# Altium footprint library 红旗_PcbLib_V1.0.PcbLib: 66 footprints (part 3 of 5)
Each footprint in its own frame and in the unit in brackets; x right, y up, seen from the top. Pads: shape width x height; smd on the part's side, far side on the other; paste and mask are expansions set on the pad; w line width, h text height; cw(c..) or ccw(c..) is an arc to the next point about the centre after c.
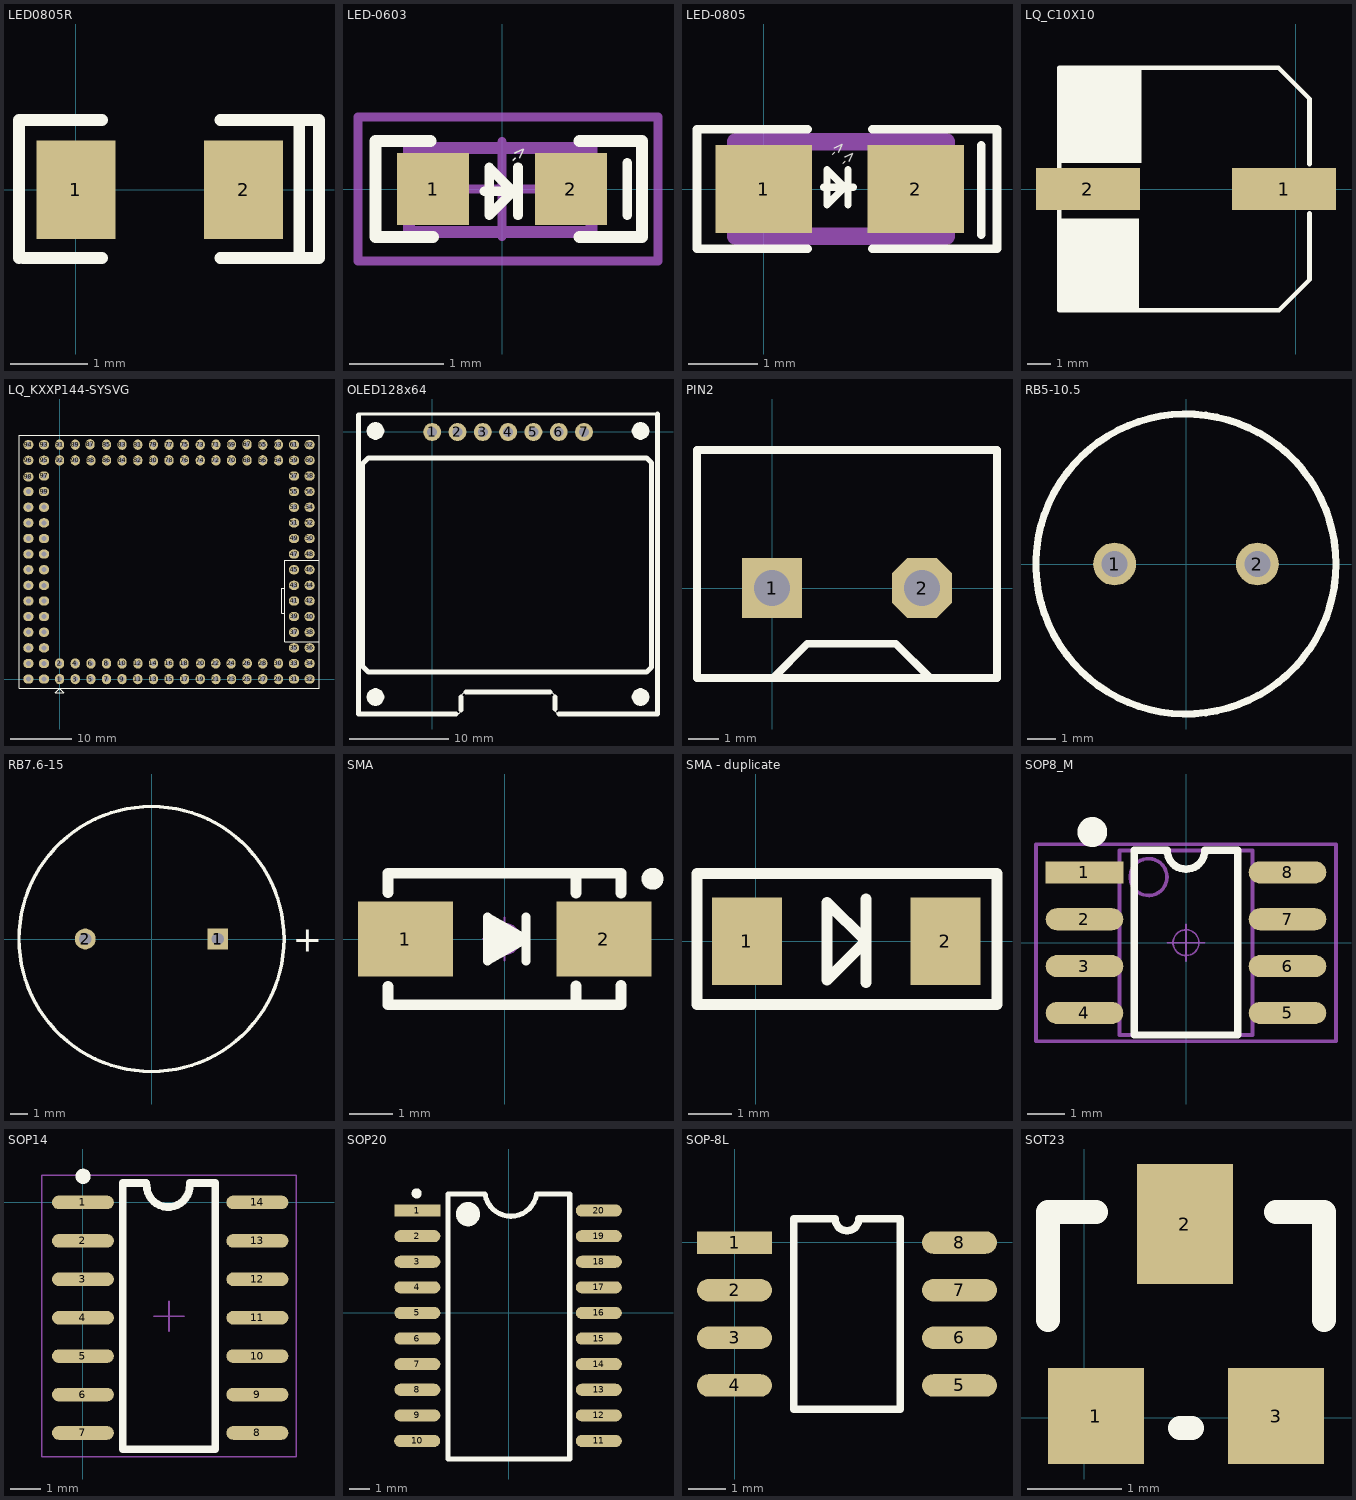
[diagram p2: the footprints below, top view; thin cyan lines are the x and y axes]

## LED0805R [mil]
pads (2):
  rect 40x50 smd: 1(0,0) 2(85,0)
Top Overlay:
  lines w5.98: 113.15,-34.61 123.15,-34.61 ; 113.15,35.39 123.15,35.39
  lines w6: -28.86,-34.61 -28.86,35.39 13.15,35.39 ; -26.85,-34.61 13.15,-34.61 ; 73.15,-34.61 113.15,-34.61 113.15,35.39 73.15,35.39 ; 123.15,-34.61 123.15,35.39
3D body "User Library-led_0805.STEP": height 43.31, standoff 0, extent 3.39,-24.21 82.91,25

## LED-0603 [mil] "Chip Inductor, Body 0.6x0.3mm, IPC High Density"
height 21.65
pads (2):
  rect 30x30 smd: 1(-28.74,0) 2(28.74,0)
Top Overlay:
  lines w4: -7.33,-1 4.67,-1 ; 6.67,-11 6.67,9 ; 52.26,-11 52.26,11 ; 4.67,-1 -5.33,9 -5.33,-11 4.67,-1
  lines w5: -29.74,19.94 -52.74,19.94 -52.74,-20.06 -28.74,-20.06 ; 32.26,-20.06 58.26,-20.06 58.26,19.94 32.26,19.94
  text "->" at 6.67,9 h8
Mechanical 13:
  lines w5: -38.74,-18 37.26,-18 37.26,17 -38.74,17 -38.74,-18
Mechanical 15:
  lines w3.94: -19.69,0 19.68,0 ; 0,-19.68 0,19.69 ; -60,-30 65,-30 65,30 -60,30 -60,-30
3D body "LED0603(B).STEP": height 23.62, standoff 0, extent -31.89,-15.75 31.89,15.74

## LED-0805 [mil]
pads (2):
  rect 55x50 smd: 1(0,0) 2(86.61,0)
Top Overlay:
  lines w4: 34,1 51.18,1 ; 48,-9 48,11 ; 36,-9 46,1 36,11 36,-9
  lines w5: 25,-34 -38,-34 -38,34 25,34 ; 62,-34 133,-34 133,34 62,34 ; 124,-26 124,25
  text "->" at 42,16 h10
  text "->" at 48,11 h10
Mechanical 13:
  lines w10: -16,-27 -16,27 104,27 104,-27 -16,-27
3D body: height 118.11, standoff 0, extent -21,-32 109,32

## LQ_C10X10 [mm]
pads (2):
  rect 4.5x1.8 smd: 1(-0.5,0) 2(-9,0)
Top Overlay:
  rectangle: -10.25,-5.25 -6.782,-1.27
  rectangle: -10.25,1.118 -6.68,5.199
  lines w0.2: 0.6,-1.06 0.6,-3.93 -0.72,-5.25 -10.25,-5.25 -10.25,5.25 -0.74,5.25 0.6,3.91 0.6,1.07

## LQ_KXXP144-SYSVG [mil]
pads (124):
  oval 59x66 hole 32: 1(0,0) 2(0,100) 3(100,0) 4(100,100) 5(200,0) 6(200,100) 7(300,0) 8(300,100) 9(400,0) 10(400,100) 11(500,0) 12(500.79,100) 13(600,0) 14(600,100) 15(700,0) 16(700,100) 17(800,0) 18(796.85,100) 19(900,0) 20(902.36,100) 21(1000,0) 22(998.82,100) 23(1100,0) 24(1097.64,100) 25(1200,0) 26(1200.39,100) 27(1300,0) 28(1300,100) 29(1400,0) 30(1400.39,100) 63(1400,1500) 64(1400,1400) 65(1300,1500) 66(1300,1400) 67(1200,1501.97) 68(1200,1400) 69(1100,1500) 70(1100,1400) 71(1000,1500) 72(1000,1400) 73(900,1500) 74(900,1400) 75(800,1500) 76(800,1400) 77(700,1500) 78(700,1400) 79(600,1500) 80(600,1400) 81(500,1500) 82(500,1400) 83(400,1500) 84(400,1400) 85(300,1500) 86(300,1400) 87(194.88,1502.36) 88(200,1400) 89(100,1500) 90(100,1400) 91(0,1500) 92(0,1400)
  oval 66x59 hole 32: 31(1500,0) 32(1600,0) 33(1500,100) 34(1600,100) 35(1500,200) 36(1600,200) 37(1500,300) 38(1600,300) 39(1500,400.79) 40(1600,400) 41(1500,500) 42(1600,500.39) 43(1500,600) 44(1600,600) 45(1500,700) 46(1600,700) 47(1500,800) 48(1600,800) 49(1500,900) 50(1600,900) 51(1500,1000) 52(1600,1000) 53(1500,1100) 54(1600,1100) 55(1500,1200) 56(1600,1200) 57(1500,1300) 58(1600,1300) 59(1500,1400) 60(1600,1400) 61(1500,1500) 62(1600,1500) 93(-100,1500) 94(-200,1500) 95(-100,1400) 96(-200,1400) 97(-100,1300) 98(-200,1294.09) 99(-100,1200) 100(-200,1200) 101(-100,1100) 102(-200,1100) 103(-100,1000) 104(-200,1000) 105(-100,899.61) 106(-200,900.39) 107(-100,800) 108(-200,800) 109(-100,700) 110(-200,700) 111(-100,600) 112(-200,600) 113(-100,500) 114(-200,500) 115(-100,400) 116(-200,400) 117(-100,300) 118(-200,300) 119(-100,200) 120(-200,200) 121(-100,100) 122(-200,100) 123(-100,0) 124(-200,0)
Top Overlay:
  lines w5.91: 1440,420 1420,420 1420,580 1440,580 ; 1660,240 1440,240 1440,760 1660,760
  lines w7.87: -1.18,-59.06 25.98,-86.61 -28.35,-86.61 -0.79,-59.06 ; -260,-60 -260,1560 1660,1560 1660,-60 -260,-60

## OLED128x64 [mm]
pads (11):
  round 1.8 hole 1: 1(-0.002,0) 2(2.538,0) 3(5.078,0) 4(7.618,0) 5(10.158,0) 6(12.698,0) 7(15.238,0)
  round 1.8 on Top Overlay: ""(-5.692,-26.595) ""(-5.692,0.105) ""(20.908,-26.595) ""(20.908,0.105)
Top Overlay:
  lines w0.1: 2.408,-28.295 ccw(c2.408,-27.795) 2.908,-27.795 ; 2.908,-26.595 cw(c3.408,-26.595) 3.408,-26.095 ; 11.808,-26.095 cw(c11.808,-26.595) 12.308,-26.595 ; 12.308,-27.795 ccw(c12.808,-27.795) 12.808,-28.295
  lines w0.3: -7.392,1.805 22.608,1.805
  lines w0.5: -7.392,1.705 -7.392,-28.295 0.108,-28.295 2.408,-28.295 ; 2.908,-27.895 2.908,-26.595 ; 3.408,-26.095 11.808,-26.095 ; 12.308,-27.795 12.308,-26.595 ; 12.708,-28.295 15.108,-28.295 22.608,-28.295 ; 22.608,-28.195 22.608,1.805 ; -6.992,-23.495 -6.992,-3.195 -6.392,-2.595 21.508,-2.595 22.008,-3.095 22.008,-23.595 21.508,-24.095 -6.392,-24.095 -6.992,-23.495

## PIN2 [mm]
pads (2):
  rect 2x2 hole 1.2: 1(0,0)
  oct 2x2 hole 1.2: 2(5,0)
Top Overlay:
  lines w0.254: 0.04,-3 1.18,-1.86 4.13,-1.86 5.27,-3 ; -2.5,-3 7.5,-3 7.5,4.6 -2.5,4.6 -2.5,-3

## RB5-10.5 [mm] "Capacitor (Radial); 2 Leads"
pads (2):
  round 1.5 hole 0.9: 1(-2.5,0) 2(2.5,0)
Top Overlay:
  circle w0.25: c0,0 r5.25
Mechanical 1:
  circle w0.02: c0,0 r5.25

## RB7.6-15 [mm] "Polarized Capacitor (Radial); 2 Leads"
pads (2):
  rect 1.2x1.2 hole 0.7: 1(3.81,0)
  round 1.2 hole 0.7: 2(-3.81,0)
Top Overlay:
  circle w0.2: c0,0 r7.62
  text "+" at 8.132,-0.737 h1.5

## SMA [mm] "4.5x2.6*2.2mm（长宽高，不包括引脚）"
height 2.54
pads (2):
  rect 2.2x1.75 smd: 1(-2.3,0) 2(2.3,0)
Top Overlay:
  circle w0.254: c3.429,1.397 r0.127
  lines w0.203: 0.494,-0.508 0.494,0.508 ; -0.395,-0.508 -0.395,0.508 0.494,0 -0.395,-0.508
  lines w0.254: -2.7,-1.105 -2.7,-1.524 2.7,-1.524 2.7,-1.08 ; -2.7,1.08 -2.7,1.524 2.7,1.524 2.7,1.067 ; -0.33,0.305 0.305,0 -0.254,-0.305 -0.254,0.051 0.023,0 ; 1.651,-1.524 1.651,-1.092 ; 1.651,1.067 1.651,1.524
Mechanical 15:
  circle w0.05: c0,0 r0.35
  lines w0.05: -0.5,0 0.5,0 ; 0,-0.5 0,0.5
3D body "SMA.STEP": height 2.15, standoff 0.04, extent -2.528,-1.3 2.575,1.3

## SMA - duplicate [mil] "DO-214AC(2010)"
pads (2):
  rect 63x78.74 smd: 1(-8,0) 2(170.56,0)
Top Overlay:
  lines w10: 99,-37 99,38 ; -53,-57 -53,61 217,61 217,-57 -53,-57 ; 64,-35 64,35 99,0 64,-35
3D body "DO-214AC.STEP": height 94.49, standoff 0, extent -7.55,-52.15 173.55,54.15

## SOP8_M [mm] "5*6*1.8mm（长宽高）"
height 1.75
pads (8):
  rect 2.1x0.6 smd: 1(-2.75,1.905)
  oval 2.1x0.6 smd: 2(-2.75,0.635) 3(-2.75,-0.635) 4(-2.75,-1.905) 5(2.75,-1.905) 6(2.75,-0.635) 7(2.75,0.635) 8(2.75,1.905)
Top Overlay:
  circle w0.5: c-2.54,3 r0.155
  lines w0.2: -1.397,2.5 -1.397,-2.5 1.397,-2.5 1.397,2.5
  lines w0.203: -1.397,2.5 -0.508,2.5 ccw(c0,2.5) 0,1.992 ccw(c0,2.5) 0.508,2.5 1.397,2.5
Mechanical 13:
  circle w0.1: c-1.016,1.778 r0.5
  lines w0.1: -1.8,-2.5 -1.8,2.5 1.8,2.5 1.8,-2.5 -1.8,-2.5
Mechanical 15:
  circle w0.05: c0,0 r0.35
  lines w0.05: -0.5,0 0.5,0 ; 0,-0.5 0,0.5
  lines w0.1: -4.064,-2.667 -4.064,2.667 4.064,2.667 4.064,-2.667 -4.064,-2.667
3D body "SOP8.STEP": height 1.9, standoff 0, extent -3.003,-2.5 3.003,2.5

## SOP14 [mm] "LM339"
height 1.8
pads (14):
  oval 2.05x0.45 smd mask+0.1: 1(0,0) 2(0,-1.27) 3(0,-2.54) 4(0,-3.81) 5(0,-5.08) 6(0,-6.35) 7(0,-7.62) 8(5.766,-7.62) 9(5.766,-6.35) 10(5.766,-5.08) 11(5.766,-3.81) 12(5.766,-2.54) 13(5.766,-1.27) 14(5.766,0)
Top Overlay:
  circle w0.25: c0.002,0.864 r0.125
  lines w0.254: 2.082,0.641 1.32,0.641 1.32,-8.159 4.37,-8.159 4.37,0.641 3.531,0.641 ; 2.108,0.559 ccw(c2.819,0.559) 3.53,0.583
Mechanical 15:
  lines w0.051: 2.345,-3.759 3.345,-3.759 ; 2.845,-4.259 2.845,-3.259 ; -1.355,-8.409 7.045,-8.409 7.045,0.891 -1.355,0.891 -1.355,-8.409
3D body "SOP14.STEP": height 1.61, standoff 0, extent -0.306,-8.16 5.894,0.54

## SOP20 [mil]
height 92.91
pads (20):
  rect 90x23.62 smd: 1(-178.5,200)
  oval 90x23.62 smd: 2(-178.5,150) 3(-178.5,100) 4(-178.5,50) 5(-178.5,0) 6(-178.5,-50) 7(-178.5,-100) 8(-178.5,-150) 9(-178.5,-200) 10(-178.9,-250) 11(175.8,-250) 12(175.8,-200) 13(175.8,-150) 14(175.8,-100) 15(175.8,-50) 16(175.8,0) 17(175.8,50) 18(175.8,100) 19(175.8,150) 20(175.8,200)
Top Overlay:
  circle w9.84: c-180.12,233.46 r4.92
  circle w23.62: c-79.72,192.91 r11.81
  lines w10: -47,232.28 -119.09,232.28 -119.09,-285 119.09,-285 119.09,232.28 54,232.28 ; -46.07,230.07 ccw(c3.97,239.91) 54,230
3D body "User Library-SO-20 (Wide).step": height 106.3, standoff 0, extent -202.75,-275.96 202.76,227.97

## SOP-8L [mm]
pads (8):
  rect 2x0.6 smd: 1(0,-0.006)
  oval 2x0.6 smd: 2(0,-1.276) 3(0,-2.546) 4(0,-3.816) 5(6,-3.816) 6(6,-2.546) 7(6,-1.276) 8(6,-0.006)
Top Overlay:
  lines w0.2: 1.585,-4.451 1.585,0.629 2.682,0.629 ccw(c3,0.629) 3.317,0.629 4.415,0.629 4.415,-4.451 1.585,-4.451

## SOT23 [mil]
pads (3):
  rect 40x40 smd: 1(4.88,0.63) 3(79.88,0.63)
  rect 40x50 smd: 2(41.88,80.63)
Top Overlay:
  lines w10: -15.12,40.63 -15.12,85.63 4.88,85.63 ; 39.88,-4.37 44.88,-4.37 ; 79.88,85.63 99.88,85.63 99.88,40.63
3D body "SOT-23-3.STEP": height 47.24, standoff 0, extent -14.87,-11.02 99.3,99.22